# Altium schematic symbol library BARKO_SCHLIB.SchLib: 1064 symbols (part 9 of 11) (continued)
## R-20K-0805 (continued)
RES SMD 20K OHM 1/8W 1% 0805; Manufacturer: Panasonic; Manufacturer Part Number: ERJ-6ENF2002V; Resistance: 20kR; Temperature Coefficient: 100ppm/°C; Max Power Dissipation: 125mW; Voltage Rating: 150V; .PCBCHK: USED; .Creator: F:TALI; Washability: OK; Stock 1: 293552; Pricing 1: 1=0.1, 10=0.081, 100=0.0311, 1000=0.01367, 2500=0.01181 (USD); Mount: Surface Mount; Case/Package: 0805; Contact Plating: Tin; Case Code (Metric): 2012; Min Operating Temperature: -55°C; Max Operating Temperature: 155°C; Tolerance: 1%; Composition: Thick Film; Packaging: Tape and Reel; Package Quantity: 1; Number of Terminations: 2; Features: Automotive AEC-Q200; Power Rating: 125mW; Military Standard: Not; Termination: SMD/SMT; Voltage Rating (DC): 150V; Working Voltage: 150V; Length: 2mm; Height: 0.6mm; Width: 0.049inch; Depth: 1.25mm; Radiation Hardening: No; REACH SVHC: No SVHC; Lead Free: Lead Free; ComponentLink1URL: http://www.farnell.com/datasheets/1911175.pdf; ComponentLink1Description: http://www.farnell.com/datasheets/1911175.pdf; ComponentLink2URL: https://www.alliedelec.com/m/d/623f45ff1957d936ff56d46fd1c28cac.pdf; ComponentLink2Description: https://www.alliedelec.com/m/d/623f45ff1957d936ff56d46fd1c28cac.pdf; ComponentLink3URL: http://industrial.panasonic.com/www-data/pdf/AOA0000/AOA0000CE2.pdf; ComponentLink3Description: http://industrial.panasonic.com/www-data/pdf/AOA0000/AOA0000CE2.pdf; ComponentLink4URL: https://www.verical.com/server-webapp/html/getDatasheet?partID=249649; ComponentLink4Description: https://www.verical.com/server-webapp/html/getDatasheet?partID=249649; ComponentLink5URL: http://www.farnell.com/datasheets/426256.pdf; ComponentLink5Description: http://www.farnell.com/datasheets/426256.pdf; ComponentLink6URL: http://www.mouser.com/ds/2/315/AOA0000C283-1093288.pdf; ComponentLink6Description: http://www.mouser.com/ds/2/315/AOA0000C283-1093288.pdf; ComponentLink7URL: http://www.farnell.com/datasheets/1678782.pdf; ComponentLink7Description: http://www.farnell.com/datasheets/1678782.pdf; Stock 2: 33862; Pricing 2: 1=0.1, 10=0.021, 100=0.0086, 1000=0.00385, 2500=0.00334 (USD); ComponentLink8URL: https://www.verical.com/server-webapp/html/getDatasheet?partID=464225; ComponentLink8Description: https://www.verical.com/server-webapp/html/getDatasheet?partID=464225; Stock 3: 3925405; Pricing 3: 1=0.1, 10=0.046, 100=0.0186, 1000=0.00835, 2500=0.00725 (USD); Number of Pins: 2; ComponentLink9URL: http://documents.rs-components.com/techlib://itc_doclist_GB.htm?stockno=6183858; ComponentLink9Description: http://documents.rs-components.com/techlib://itc_doclist_GB.htm?stockno=6183858; ComponentLink10URL: https://www.verical.com/server-webapp/html/getDatasheet?partID=330251; ComponentLink10Description: https://www.verical.com/server-webapp/html/getDatasheet?partID=330251; ComponentLink11URL: http://www.farnell.com/datasheets/444164.pdf; ComponentLink11Description: http://www.farnell.com/datasheets/444164.pdf; ComponentLink12URL: http://www.yageo.ru/pdf/RC0805.pdf; ComponentLink12Description: http://www.yageo.ru/pdf/RC0805.pdf; .SCHCHK: USED; Supplier 1: Digi-Key; Supplier Part Number 1: P20.0KCDKR-ND
footprint R-0805
pins: 1, 2

## R-20R-1206
designator R?, comment 20R  Power Rating: 1/4W  Case Code (Imperial): 1206
RES SMD 20 OHM 1/4W 5% 1206; Manufacturer: Yageo; Manufacturer Part Number: RC1206JR-0720RL; Temperature Coefficient: 100ppm/°C; Voltage Rating: 200V; Max Power Dissipation: 250mW; .PCBCHK: USED; .Creator: F:TALI; Washability: OK; Stock 1: 401769; Pricing 1: 1=0.1, 10=0.07, 100=0.0284, 1000=0.01274, 2500=0.01106 (USD); Case/Package: 1206; Contact Plating: Matte,Tin; Case Code (Metric): 3216; Min Operating Temperature: -55°C; Max Operating Temperature: 155°C; Resistance: 20R; Tolerance: 5%; Composition: Thick Film; Packaging: Tape and Reel; Termination: SMD/SMT; Military Standard: Not; Voltage Rating (DC): 200V; Length: 3.1mm; Depth: 1.6mm; Radiation Hardening: No; Lead Free: Lead Free; ComponentLink1URL: http://www.yageo.com/documents/recent/PYu-RC1206_51_RoHS_L-4.pdf; ComponentLink1Description: http://www.yageo.com/documents/recent/PYu-RC1206_51_RoHS_L-4.pdf; Stock 2: 32269; Pricing 2: 1=0.1, 10=0.043, 100=0.0173, 1000=0.00778, 2500=0.00676 (USD); Mount: Surface Mount; Package Quantity: 1; Number of Terminations: 2; Features: Moisture Resistant; Height: 0.03inch; Width: 0.063inch; Thickness: 610um; ComponentLink2URL: http://www.bourns.com/docs/Product-Datasheets/CHPREZTR.pdf; ComponentLink2Description: http://www.bourns.com/docs/Product-Datasheets/CHPREZTR.pdf; ComponentLink3URL: http://www.mouser.com/ds/2/54/chpreztr-977002.pdf; ComponentLink3Description: http://www.mouser.com/ds/2/54/chpreztr-977002.pdf; ComponentLink4URL: https://www.bourns.com/docs/Product-Datasheets/CHPREZTR.pdf; ComponentLink4Description: https://www.bourns.com/docs/Product-Datasheets/CHPREZTR.pdf; ComponentLink5URL: http://www.bourns.com/pdfs/chpreztr.pdf; ComponentLink5Description: http://www.bourns.com/pdfs/chpreztr.pdf; Weight: 0.000353oz; Working Voltage: 200V; REACH SVHC: Unknown; ComponentLink6URL: http://www.vishay.com/docs/20035/dcrcwe3.pdf; ComponentLink6Description: http://www.vishay.com/docs/20035/dcrcwe3.pdf; ComponentLink7URL: https://www.alliedelec.com/m/d/0c934d6939ccefa68dbe0b96d821c8cf.pdf; ComponentLink7Description: https://www.alliedelec.com/m/d/0c934d6939ccefa68dbe0b96d821c8cf.pdf; ComponentLink8URL: http://www.farnell.com/datasheets/2046716.pdf; ComponentLink8Description: http://www.farnell.com/datasheets/2046716.pdf; ComponentLink9URL: http://www.farnell.com/datasheets/2111203.pdf; ComponentLink9Description: http://www.farnell.com/datasheets/2111203.pdf; ComponentLink10URL: http://www.mouser.com/ds/2/427/dcrcwe3-109170.pdf; ComponentLink10Description: http://www.mouser.com/ds/2/427/dcrcwe3-109170.pdf; Stock 3: 63200; Pricing 3: 100=0.0169, 1000=0.0069, 5000=0.0043, 15000=0.0038, 50000=0.0035 (USD); .SCHCHK: USED; Supplier 1: Digi-Key; Supplier Part Number 1: 311-20ERCT-ND
footprint R-1206
pins: 1, 2

## R-22K1-0805
designator R?, comment 22K1  Case/Package: 0805
RES 22.1K OHM 1% 1/8W 0805; Manufacturer 1: Stackpole Electronics; Manufacturer Part Number: RMCF0805FT22K1; Resistance: 22.1kR; Power Rating: 125mW; Temperature Coefficient: 100ppm/°C; .Creator: M.OZKAN; .PCBCHK: USED; Supplier 1: Digi-Key; Supplier Part Number 1: RMCF0805FT22K1CT-ND; RoHS: Yes; Category: Chip SMD Resistors; Stock: 28900; Pricing: 1=0,10000, 10=0,02600, 100=0,01040, 1000=0,00466, 2500=0,00405 (USD); Mount: Surface Mount; Case Code (Metric): 2012; Case Code (Imperial): 0805; Contact Plating: Tin,Matte; Min Operating Temperature: -55°C; Max Operating Temperature: 155°C; Features: Automotive AEC-Q200; Packaging: Tape and Reel; Tolerance: 1%; Number of Terminations: 2; Military Standard: Not; Composition: Thick Film; Max Power Dissipation: 125mW; Length: 0.079inch; Height: 0.026inch; Width: 0.049inch; Depth: 1.25mm; Radiation Hardening: No; Lead Free: Lead Free; ComponentLink1URL: https://datasheet.ciiva.com/15193/getdatasheetpartid-409700-15193558.pdf?src-supplier=Verical; ComponentLink1Description: https://datasheet.ciiva.com/15193/getdatasheetpartid-409700-15193558.pdf?src-supplier=Verical; .SCHCHK: USED
footprint R-0805
pins: 1, 2

## R-22K-0603
designator R?, comment 22K  Case Code (Imperial): 0603
RES SMD 22K OHM 1% 1/8W 0603; Manufacturer: Vishay Beyschlag; Manufacturer Part Number: MCT06030C2202FP500; Resistance: 22kR; Temperature Coefficient: 50ppm/°C; Power Rating: 125mW; Voltage Rating: 75V; .PCBCHK: USED; .Creator: F:TALI; Washability: OK; Supplier 1: Digi-Key; Supplier Part Number 1: MCT0603-22.0K-CFDKR-ND; Stock 1: 132469; Pricing 1: 1=0.18, 10=0.152, 100=0.0596, 1000=0.02495, 2500=0.02287 (USD); Case/Package: 0603; Contact Plating: Tin; Case Code (Metric): 1608; Min Operating Temperature: -55°C; Max Operating Temperature: 125°C; Tolerance: 1%; Composition: Thin Film; Package Quantity: 5000; Packaging: Tape and Reel; Number of Terminations: 2; Military Standard: Not; Max Power Dissipation: 125mW; Voltage Rating (DC): 75V; Length: 0.061inch; Height: 0.022inch; Width: 0.033inch; Depth: 0.85mm; Radiation Hardening: No; REACH SVHC: No SVHC; Lead Free: Lead Free; ComponentLink1URL: http://www.vishay.com/docs/28705/mc_pro.pdf; ComponentLink1Description: http://www.vishay.com/docs/28705/mc_pro.pdf; .SCHCHK: USED
footprint R-0603
pins: 1, 2

## R-22K-0805
designator R?, comment 22K  Case/Package: 0805
RES SMD 22K OHM 1% 1/8W 0805; Manufacturer: Yageo; Manufacturer Part Number: RC0805FR-0722KL; Resistance: 22kR; Temperature Coefficient: 100ppm/°C; Power Rating: 125mW; Voltage Rating: 150V; .PCBCHK: USED; .Creator: F:TALI; Washability: OK; Stock 1: 409524; Weight: 0.000194oz; Case Code (Imperial): 0805; Case Code (Metric): 2012; Min Operating Temperature: -55°C; Max Operating Temperature: 155°C; Tolerance: 1%; Packaging: Tape and Reel; Composition: Thick Film; Package Quantity: 1; Termination: SMD/SMT; Number of Terminations: 2; Military Standard: Not; Max Power Dissipation: 125mW; Working Voltage: 150V; Features: Moisture Resistant; Length: 2mm; Height: 0.5mm; Width: 1.25mm; Depth: 1.25mm; REACH SVHC: Unknown; Lead Free: Lead Free; ComponentLink1URL: http://www.mouser.com/ds/2/447/Yageo_08112016_RC0805-968729.pdf; ComponentLink1Description: http://www.mouser.com/ds/2/447/Yageo_08112016_RC0805-968729.pdf; ComponentLink2URL: http://www.farnell.com/datasheets/444164.pdf; ComponentLink2Description: http://www.farnell.com/datasheets/444164.pdf; ComponentLink3URL: http://www.yageo.com/documents/recent/PYu-RC_Group_51_RoHS_L_9.pdf; ComponentLink3Description: http://www.yageo.com/documents/recent/PYu-RC_Group_51_RoHS_L_9.pdf; ComponentLink4URL: http://www.yageo.com/documents/recent/PYu-RC_Group_51_RoHS_L_8.pdf; ComponentLink4Description: http://www.yageo.com/documents/recent/PYu-RC_Group_51_RoHS_L_8.pdf; ComponentLink5URL: http://www.yageo.ru/pdf/RC0805.pdf; ComponentLink5Description: http://www.yageo.ru/pdf/RC0805.pdf; Stock 2: 239333; Pricing 2: 1=0.1, 10=0.059, 100=0.024, 1000=0.01079, 2500=0.00936 (USD); Contact Plating: Tin; Voltage Rating (DC): 150V; Radiation Hardening: No; ComponentLink6URL: http://www.samsungsem.com/kr/support/library/product-catalog/__icsFiles/afieldfile/2015/09/22/CHIP_RESISTOR_2015.pdf; ComponentLink6Description: http://www.samsungsem.com/kr/support/library/product-catalog/__icsFiles/afieldfile/2015/09/22/CHIP_RESISTOR_2015.pdf; ComponentLink7URL: http://www.samsungsem.com/kr/support/product-search/chip-resistor/RC2012F223CS.jsp; ComponentLink7Description: http://www.samsungsem.com/kr/support/product-search/chip-resistor/RC2012F223CS.jsp; Stock 3: 292101; Pricing 3: 1=0.1, 10=0.091, 100=0.0349, 1000=0.01536, 2500=0.01327 (USD); Mount: Surface Mount; Number of Pins: 2; ComponentLink8URL: http://www.mouser.com/ds/2/315/AOA0000CE2-37512.pdf; ComponentLink8Description: http://www.mouser.com/ds/2/315/AOA0000CE2-37512.pdf; ComponentLink9URL: http://www.farnell.com/datasheets/426256.pdf; ComponentLink9Description: http://www.farnell.com/datasheets/426256.pdf; ComponentLink10URL: http://www.farnell.com/datasheets/1678782.pdf; ComponentLink10Description: http://www.farnell.com/datasheets/1678782.pdf; ComponentLink11URL: https://www.alliedelec.com/m/d/623f45ff1957d936ff56d46fd1c28cac.pdf; ComponentLink11Description: https://www.alliedelec.com/m/d/623f45ff1957d936ff56d46fd1c28cac.pdf; ComponentLink12URL: http://industrial.panasonic.com/www-data/pdf/AOA0000/AOA0000CE2.pdf; ComponentLink12Description: http://industrial.panasonic.com/www-data/pdf/AOA0000/AOA0000CE2.pdf; .SCHCHK: USED; Supplier 1: Digi-Key; Supplier Part Number 1: 311-22.0KCRCT-ND
footprint R-0805
pins: 1, 2

## R-22K-1206
designator R?, comment 22K  Power Rating: 1/4W  Case Code (Imperial): 1206
RES SMD 22K OHM 1% 1/4W 1206; Manufacturer: Panasonic; Manufacturer Part Number: ERJ-8ENF2202V; Resistance: 22kR; Temperature Coefficient: 100ppm/°C; Voltage Rating: 200V; Max Power Dissipation: 250mW; .PCBCHK: USED; .Creator: F:TALI; Washability: OK; Stock 1: 5013; Pricing 1: 1=0.11, 10=0.1, 100=0.0385, 1000=0.01695, 2500=0.01464 (USD); Mount: Surface Mount; Case/Package: 1206; Number of Pins: 2; Contact Plating: Tin; Case Code (Metric): 3216; Min Operating Temperature: -55°C; Max Operating Temperature: 155°C; Tolerance: 1%; Composition: Thick Film; Packaging: Tape and Reel; Package Quantity: 1; Number of Terminations: 2; Termination: SMD/SMT; Military Standard: Not; Voltage Rating (DC): 200V; Features: Automotive AEC-Q200; Length: 3.2mm; Height: 0.6mm; Width: 0.063inch; Depth: 1.6mm; Radiation Hardening: No; REACH SVHC: No SVHC; ComponentLink1URL: http://www.farnell.com/datasheets/1678782.pdf; ComponentLink1Description: http://www.farnell.com/datasheets/1678782.pdf; ComponentLink2URL: http://www.farnell.com/datasheets/426256.pdf; ComponentLink2Description: http://www.farnell.com/datasheets/426256.pdf; ComponentLink3URL: http://www.mouser.com/ds/2/315/AOA0000C283-1093288.pdf; ComponentLink3Description: http://www.mouser.com/ds/2/315/AOA0000C283-1093288.pdf; Stock 2: 28064; Pricing 2: 1=0.1, 10=0.064, 100=0.026, 1000=0.01166, 2500=0.01012 (USD); Thickness: 610um; ComponentLink4URL: http://www.mouser.com/ds/2/54/chpreztr-977002.pdf; ComponentLink4Description: http://www.mouser.com/ds/2/54/chpreztr-977002.pdf; ComponentLink5URL: http://www.bourns.com/docs/Product-Datasheets/CHPREZTR.pdf; ComponentLink5Description: http://www.bourns.com/docs/Product-Datasheets/CHPREZTR.pdf; ComponentLink6URL: http://www.bourns.com/pdfs/chpreztr.pdf; ComponentLink6Description: http://www.bourns.com/pdfs/chpreztr.pdf; ComponentLink7URL: https://www.bourns.com/docs/Product-Datasheets/CHPREZTR.pdf; ComponentLink7Description: https://www.bourns.com/docs/Product-Datasheets/CHPREZTR.pdf; Stock 3: 26462; Pricing 3: 1=0.1, 10=0.03, 100=0.0121, 1000=0.00545, 2500=0.00473 (USD); Lead Free: Lead Free; ComponentLink8URL: https://www.verical.com/server-webapp/html/getDatasheet?partID=369949; ComponentLink8Description: https://www.verical.com/server-webapp/html/getDatasheet?partID=369949; .SCHCHK: USED; Supplier 1: Digi-Key; Supplier Part Number 1: P22.0KFDKR-ND
footprint R-1206
pins: 1, 2

## R-22R-0603
designator R?, comment 22R  Case Code (Imperial): 0603
RES SMD 22 OHM 5% 1/10W 0603; Manufacturer: Yageo; Manufacturer Part Number: RC0603JR-0722RL; Temperature Coefficient: 100ppm/°C; Power Rating: 100mW; Voltage Rating: 50V; .PCBCHK: USED; .Creator: F:TALI; Washability: OK; Stock 1: 3612; Pricing 1: 1=0.1, 10=0.022, 100=0.0088, 1000=0.00396, 2500=0.00344 (USD); Case/Package: 0603; Number of Pins: 2; Case Code (Metric): 1608; Min Operating Temperature: -55°C; Max Operating Temperature: 155°C; Resistance: 22R; Tolerance: 5%; Packaging: Tape and Reel; Composition: Thick Film; Military Standard: Not; Voltage Rating (DC): 50V; Termination: SMD/SMT; Length: 1.6mm; Depth: 0.8mm; Width: 0.8mm; Lead Free: Lead Free; REACH SVHC: No SVHC; ComponentLink1URL: https://www.verical.com/server-webapp/html/getDatasheet?partID=493085; ComponentLink1Description: https://www.verical.com/server-webapp/html/getDatasheet?partID=493085; ComponentLink2URL: http://www.farnell.com/datasheets/443971.pdf; ComponentLink2Description: http://www.farnell.com/datasheets/443971.pdf; Stock 2: 152242; Pricing 2: 1=0.1, 10=0.033, 100=0.0136, 1000=0.00609, 2500=0.00529 (USD); Contact Plating: Tin; Package Quantity: 1; Number of Terminations: 2; Max Power Dissipation: 100mW; Features: Moisture Resistant; Height: 0.022inch; Radiation Hardening: No; Mount: Surface Mount; Weight: 7.1E-05oz; ComponentLink3URL: http://www.farnell.com/datasheets/1678782.pdf; ComponentLink3Description: http://www.farnell.com/datasheets/1678782.pdf; ComponentLink4URL: http://www.farnell.com/datasheets/1911175.pdf; ComponentLink4Description: http://www.farnell.com/datasheets/1911175.pdf; ComponentLink5URL: http://www.farnell.com/datasheets/426256.pdf; ComponentLink5Description: http://www.farnell.com/datasheets/426256.pdf; Stock 3: 1570000; Pricing 3: 100=0.0125, 1000=0.0035, 5000=0.002, 15000=0.00165, 50000=0.0014 (USD); .SCHCHK: USED; Supplier 1: Digi-Key; Supplier Part Number 1: 311-22GRCT-ND
footprint R-0603
pins: 1, 2

## R-24K3-0402
designator R?, comment 24K3  Case Code (Imperial): 0402
RES SMD 24.3K OHM 1% 1/10W 0402; Manufacturer: Panasonic; Manufacturer Part Number: ERJ-2RKF2432X; Resistance: 24.3kR; Power Rating: 100mW; Voltage Rating: 50V; Temperature Coefficient: 100ppm/°C; .PCBCHK: USED; .Creator: F:TALI; Washability: OK; Stock 1: 471142; Pricing 1: 1=0.1, 10=0.045, 100=0.0183, 1000=0.00823, 2500=0.00715, 5000=0.0059 (USD); Mount: Surface Mount; Case/Package: 0402; Case Code (Metric): 1005; Contact Plating: Tin; Min Operating Temperature: -55°C; Max Operating Temperature: 155°C; Packaging: Tape and Reel; Tolerance: 1%; Package Quantity: 1; Composition: Thick Film; Number of Terminations: 2; Termination: SMD/SMT; Military Standard: Not; Max Power Dissipation: 100mW; Voltage Rating (DC): 50V; Features: Automotive AEC-Q200; Length: 1mm; Height: 0.35mm; Width: 0.02inch; Depth: 0.5mm; Radiation Hardening: No; REACH SVHC: No SVHC; Lead Free: Lead Free; ComponentLink1URL: http://www.industrial.panasonic.com/www-data/pdf/AOA0000/AOA0000CE2.pdf; ComponentLink1Description: http://www.industrial.panasonic.com/www-data/pdf/AOA0000/AOA0000CE2.pdf; ComponentLink2URL: http://www.farnell.com/datasheets/1911175.pdf; ComponentLink2Description: http://www.farnell.com/datasheets/1911175.pdf; ComponentLink3URL: https://www.alliedelec.com/m/d/623f45ff1957d936ff56d46fd1c28cac.pdf; ComponentLink3Description: https://www.alliedelec.com/m/d/623f45ff1957d936ff56d46fd1c28cac.pdf; ComponentLink4URL: http://www.farnell.com/datasheets/1678782.pdf; ComponentLink4Description: http://www.farnell.com/datasheets/1678782.pdf; ComponentLink5URL: http://www.mouser.com/ds/2/315/AOA0000CE2-37512.pdf; ComponentLink5Description: http://www.mouser.com/ds/2/315/AOA0000CE2-37512.pdf; Stock 2: 9465; Pricing 2: 1=0.1, 10=0.021, 100=0.0087, 1000=0.00391, 2500=0.00339, 5000=0.0028 (USD); ComponentLink6URL: http://www.samsungsem.com/kr/support/library/product-catalog/__icsFiles/afieldfile/2015/09/22/CHIP_RESISTOR_2015.pdf; ComponentLink6Description: http://www.samsungsem.com/kr/support/library/product-catalog/__icsFiles/afieldfile/2015/09/22/CHIP_RESISTOR_2015.pdf; ComponentLink7URL: http://www.samsungsem.com/kr/support/product-search/chip-resistor/RC1005F2432CS.jsp; ComponentLink7Description: http://www.samsungsem.com/kr/support/product-search/chip-resistor/RC1005F2432CS.jsp; ComponentLink8URL: https://produktinfo.conrad.com/datenblaetter/625000-649999/631765-da-01-en-SMD_WID_RC_1005_24K3_1__0_063W_10000ST.pdf; ComponentLink8Description: https://produktinfo.conrad.com/datenblaetter/625000-649999/631765-da-01-en-SMD_WID_RC_1005_24K3_1__0_063W_10000ST.pdf; Stock 3: 6427; Pricing 3: 1=0.1, 10=0.016, 100=0.0064, 1000=0.00289, 2500=0.0025, 5000=0.00207 (USD); Working Voltage: 50V; .SCHCHK: USED; Supplier 1: Digi-Key; Supplier Part Number 1: RMCF0402FT24K3CT-ND
footprint R-0402
pins: 1, 2

## R-24K9-0603
designator R?, comment 24K9  Case/Package: 0603  Tolerance: 1%
RES 24.9K OHM 1% 1/10W 0603; Manufacturer: Stackpole Electronics; Manufacturer Part Number: RMCF0603FT24K9; Resistance: 24.9kR; Power Rating: 100mW; Temperature Coefficient: 100ppm/°C; .Creator: M.OZKAN; .PCBCHK: USED; Supplier 1: Digi-Key; Supplier Part Number 1: RMCF0603FT24K9CT-ND; Stock: 149638; Pricing: 1=0.1, 10=0.016, 100=0.0065, 1000=0.0029, 2500=0.0025 (USD); RoHS: Yes; Mount: Surface Mount; Case Code (Imperial): 0603; Contact Plating: Tin,Matte; Case Code (Metric): 1608; Min Operating Temperature: -55°C; Max Operating Temperature: 155°C; Packaging: Tape and Reel; Composition: Thick Film; Number of Terminations: 2; Max Power Dissipation: 100mW; Features: Automotive AEC-Q200; Length: 0.061inch; Height: 0.022inch; Width: 0.031inch; Radiation Hardening: No; Lead Free: Lead Free; ComponentLink1URL: http://components.arrow.com/part/dataview/50576347S797719N1174?src-supplier=Arrow; ComponentLink1Description: http://components.arrow.com/part/dataview/50576347S797719N1174?src-supplier=Arrow; ComponentLink2URL: http://www.seielect.com/Catalog/SEI-RMC.pdf?src-supplier=Future+Electronics; ComponentLink2Description: http://www.seielect.com/Catalog/SEI-RMC.pdf?src-supplier=Future+Electronics; ComponentLink3URL: https://www.seielect.com/catalog/SEI-RMCF_RMCP.pdf?src-supplier=Avnet; ComponentLink3Description: https://www.seielect.com/catalog/SEI-RMCF_RMCP.pdf?src-supplier=Avnet; ComponentLink4URL: https://www.seielect.com/catalog/SEI-Packaging.pdf?src-supplier=Digi-Key; ComponentLink4Description: https://www.seielect.com/catalog/SEI-Packaging.pdf?src-supplier=Digi-Key; ComponentLink5URL: https://www.seielect.com/catalog/SEI-RMCF_RMCP.pdf?src-supplier=Avnet+Asia; ComponentLink5Description: https://www.seielect.com/catalog/SEI-RMCF_RMCP.pdf?src-supplier=Avnet+Asia; ComponentLink6URL: https://www.seielect.com/Catalog/SEI-RMCF_RMCP.pdf?src-supplier=Digi-Key; ComponentLink6Description: https://www.seielect.com/Catalog/SEI-RMCF_RMCP.pdf?src-supplier=Digi-Key; .SCHCHK: USED
footprint R-0603
pins: 1, 2

## R-27K-0603
designator R?, comment 27K  Case/Package: 0603
RES SMD 27K OHM 1% 1/10W 0603; Manufacturer: Yageo; Manufacturer Part Number: RC0603FR-0727KL; Resistance: 27kR; Temperature Coefficient: 100ppm/°C; Max Power Dissipation: 100mW; Voltage Rating: 50V; Working Voltage: 75V; Washability: OK; .Creator: M.OZKAN; .PCBCHK: USED; Supplier 1: Digi-Key; Supplier Part Number 1: 311-27.0KHRCT-ND; Stock 1: 2530598; Pricing 1: 1=0.10000, 10=0.02300, 100=0.00940, 1000=0.00421, 2500=0.00366 (USD); RoHS: Yes; Number of Pins: 2; Case Code (Metric): 1608; Case Code (Imperial): 0603; Min Operating Temperature: -55°C; Max Operating Temperature: 155°C; Tolerance: 1%; Composition: Thick Film; Packaging: Tape and Reel; Number of Terminations: 2; Power Rating: 100mW; Features: Moisture Resistant; Termination: SMD/SMT; Military Standard: Not; Voltage Rating (DC): 50V; Package Quantity: 1; Length: 0.063inch; Height: 0.022inch; Width: 0.031inch; Depth: 0.8mm; Lead Free: Lead Free; REACH SVHC: No SVHC; ComponentLink1URL: https://datasheet.ciiva.com/11808/0900766b80f96399-11808540.pdf?src-supplier=RSComponents; ComponentLink1Description: https://datasheet.ciiva.com/11808/0900766b80f96399-11808540.pdf?src-supplier=RSComponents; ComponentLink2URL: https://datasheet.ciiva.com/2453/pyu-r-int-thick-7-2453968.pdf?src-supplier=Digi-Key; ComponentLink2Description: https://datasheet.ciiva.com/2453/pyu-r-int-thick-7-2453968.pdf?src-supplier=Digi-Key; ComponentLink3URL: https://datasheet.ciiva.com/2453/pyu-r-int-thick-7-2453969.pdf?src-supplier=Digi-Key; ComponentLink3Description: https://datasheet.ciiva.com/2453/pyu-r-int-thick-7-2453969.pdf?src-supplier=Digi-Key; ComponentLink4URL: https://datasheet.ciiva.com/7746/443971-7746311.pdf?src-supplier=Element14; ComponentLink4Description: https://datasheet.ciiva.com/7746/443971-7746311.pdf?src-supplier=Element14; ComponentLink5URL: https://datasheet.ciiva.com/7746/443971-7746312.pdf?src-supplier=Element14; ComponentLink5Description: https://datasheet.ciiva.com/7746/443971-7746312.pdf?src-supplier=Element14; ComponentLink6URL: https://datasheet.ciiva.com/15159/getdatasheetpartid-45811-15159564.pdf?src-supplier=Verical; ComponentLink6Description: https://datasheet.ciiva.com/15159/getdatasheetpartid-45811-15159564.pdf?src-supplier=Verical; ComponentLink7URL: https://datasheet.ciiva.com/2453/pyu-r-int-thick-7-2453967.pdf?src-supplier=Digi-Key; ComponentLink7Description: https://datasheet.ciiva.com/2453/pyu-r-int-thick-7-2453967.pdf?src-supplier=Digi-Key; ComponentLink8URL: https://datasheet.ciiva.com/46412/443971-46412847.pdf?src-supplier=Element14; ComponentLink8Description: https://datasheet.ciiva.com/46412/443971-46412847.pdf?src-supplier=Element14; .SCHCHK: USED
footprint R-0603
pins: 1, 2

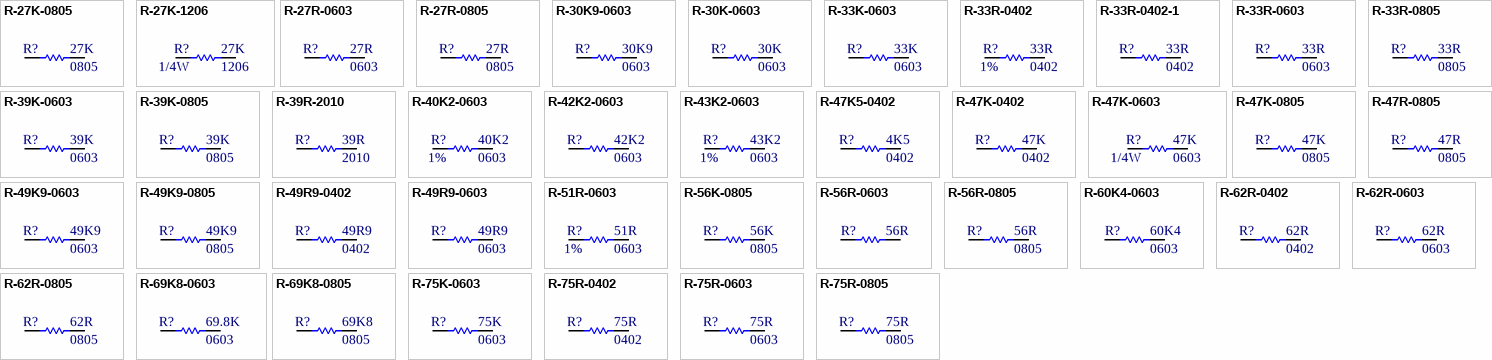
[diagram p38: symbols R-27K-0805 to R-75R-0805]

## R-27K-0805
designator R?, comment 27K  Case/Package: 0805
RES SMD 27K OHM 1% 1/8W 0805; Manufacturer: Yageo; Manufacturer Part Number: RC0805FR-0727KL; Resistance: 27kR; Temperature Coefficient: 100ppm/°C; Power Rating: 125mW; Voltage Rating: 150V; .PCBCHK: USED; .Creator: F:TALI; Washability: OK; Stock 1: 5708; Pricing 1: 1=0.1, 10=0.046, 100=0.0186, 1000=0.00835, 2500=0.00725 (USD); Case Code (Metric): 2012; Case Code (Imperial): 0805; Min Operating Temperature: -55°C; Max Operating Temperature: 155°C; Tolerance: 1%; Composition: Thick Film; Packaging: Tape and Reel; Package Quantity: 1; Number of Terminations: 2; Termination: SMD/SMT; Military Standard: Not; Max Power Dissipation: 125mW; Features: Moisture Resistant; Length: 2mm; Height: 0.5mm; Width: 0.049inch; Depth: 1.25mm; REACH SVHC: Unknown; Lead Free: Lead Free; ComponentLink1URL: http://www.yageo.com.tw/exep/pages/download/literatures/PYu-R_INT-thick_7.pdf; ComponentLink1Description: http://www.yageo.com.tw/exep/pages/download/literatures/PYu-R_INT-thick_7.pdf; ComponentLink2URL: http://www.yageo.com/documents/recent/PYu-RC_Group_51_RoHS_L_9.pdf; ComponentLink2Description: http://www.yageo.com/documents/recent/PYu-RC_Group_51_RoHS_L_9.pdf; ComponentLink3URL: http://documents.rs-components.com/techlib://itc_doclist_GB.htm?stockno=6184198; ComponentLink3Description: http://documents.rs-components.com/techlib://itc_doclist_GB.htm?stockno=6184198; ComponentLink4URL: http://www.farnell.com/datasheets/444164.pdf; ComponentLink4Description: http://www.farnell.com/datasheets/444164.pdf; Stock 2: 91448; Pricing 2: 1=0.1, 10=0.081, 100=0.0311, 1000=0.01367, 2500=0.01181 (USD); Mount: Surface Mount; Number of Pins: 2; Contact Plating: Tin; Voltage Rating (DC): 150V; Radiation Hardening: No; ComponentLink5URL: http://www.farnell.com/datasheets/1678782.pdf; ComponentLink5Description: http://www.farnell.com/datasheets/1678782.pdf; ComponentLink6URL: http://www.farnell.com/datasheets/426256.pdf; ComponentLink6Description: http://www.farnell.com/datasheets/426256.pdf; ComponentLink7URL: http://industrial.panasonic.com/www-data/pdf/AOA0000/AOA0000CE2.pdf; ComponentLink7Description: http://industrial.panasonic.com/www-data/pdf/AOA0000/AOA0000CE2.pdf; ComponentLink8URL: https://www.alliedelec.com/m/d/623f45ff1957d936ff56d46fd1c28cac.pdf; ComponentLink8Description: https://www.alliedelec.com/m/d/623f45ff1957d936ff56d46fd1c28cac.pdf; Stock 3: 65860; Pricing 3: 1=0.1, 10=0.059, 100=0.024, 1000=0.01079, 2500=0.00936 (USD); ComponentLink9URL: http://www.samsungsem.com/kr/support/library/product-catalog/__icsFiles/afieldfile/2015/09/22/CHIP_RESISTOR_2015.pdf; ComponentLink9Description: http://www.samsungsem.com/kr/support/library/product-catalog/__icsFiles/afieldfile/2015/09/22/CHIP_RESISTOR_2015.pdf; .SCHCHK: USED; Supplier 1: Digi-Key; Supplier Part Number 1: 311-27.0KCRDKR-ND
footprint R-0805
pins: 1, 2

## R-27K-1206
designator R?, comment 27K  Power Rating: 1/4W  Case Code (Imperial): 1206
RES SMD 27K OHM 1% 1/4W 1206; Manufacturer: Panasonic; Manufacturer Part Number: ERJ-8ENF2702V; Resistance: 27kR; Temperature Coefficient: 100ppm/°C; Voltage Rating: 200V; Max Power Dissipation: 250mW; .PCBCHK: USED; .Creator: F:TALI; Washability: OK; Stock 1: 25351; Pricing 1: 1=0.11, 10=0.1, 100=0.0385, 1000=0.01695, 2500=0.01464 (USD); Mount: Surface Mount; Case/Package: 1206; Number of Pins: 2; Contact Plating: Tin; Case Code (Metric): 3216; Min Operating Temperature: -55°C; Max Operating Temperature: 155°C; Tolerance: 1%; Composition: Thick Film; Packaging: Tape and Reel; Package Quantity: 1; Number of Terminations: 2; Termination: SMD/SMT; Military Standard: Not; Voltage Rating (DC): 200V; Features: Automotive AEC-Q200; Length: 3.2mm; Height: 0.028inch; Width: 0.063inch; Depth: 1.6mm; Radiation Hardening: No; REACH SVHC: No SVHC; ComponentLink1URL: http://www.farnell.com/datasheets/426256.pdf; ComponentLink1Description: http://www.farnell.com/datasheets/426256.pdf; ComponentLink2URL: http://www.mouser.com/ds/2/315/AOA0000CE2-37512.pdf; ComponentLink2Description: http://www.mouser.com/ds/2/315/AOA0000CE2-37512.pdf; ComponentLink3URL: http://industrial.panasonic.com/www-data/pdf/AOA0000/AOA0000CE2.pdf; ComponentLink3Description: http://industrial.panasonic.com/www-data/pdf/AOA0000/AOA0000CE2.pdf; ComponentLink4URL: http://www.industrial.panasonic.com/www-data/pdf/AOA0000/AOA0000CE2.pdf; ComponentLink4Description: http://www.industrial.panasonic.com/www-data/pdf/AOA0000/AOA0000CE2.pdf; Stock 2: 87290; Pricing 2: 1=0.1, 10=0.081, 100=0.0331, 1000=0.01487, 2500=0.01291 (USD); Lead Free: Lead Free; ComponentLink5URL: http://www.yageo.com/documents/recent/PYu-RC1206_51_RoHS_L-4.pdf; ComponentLink5Description: http://www.yageo.com/documents/recent/PYu-RC1206_51_RoHS_L-4.pdf; ComponentLink6URL: http://www.yageo.com/documents/recent/PYu-RC_Group_51_RoHS_L_9.pdf; ComponentLink6Description: http://www.yageo.com/documents/recent/PYu-RC_Group_51_RoHS_L_9.pdf; ComponentLink7URL: http://www.yageo.com.tw/exep/pages/download/literatures/PYu-R_INT-thick_7.pdf; ComponentLink7Description: http://www.yageo.com.tw/exep/pages/download/literatures/PYu-R_INT-thick_7.pdf; ComponentLink8URL: http://www.farnell.com/datasheets/444357.pdf; ComponentLink8Description: http://www.farnell.com/datasheets/444357.pdf; Stock 3: 43; Pricing 3: 1=0.1, 10=0.029 (USD); ComponentLink9URL: //media.digikey.com/pdf/Data%20Sheets/Rohm%20PDFs/MCR18_SeriesComparativeSpec.pdf; ComponentLink9Description: //media.digikey.com/pdf/Data%20Sheets/Rohm%20PDFs/MCR18_SeriesComparativeSpec.pdf; .SCHCHK: USED; Supplier 1: Digi-Key; Supplier Part Number 1: P27.0KFCT-ND
footprint R-1206
pins: 1, 2

## R-27R-0603
designator R?, comment 27R  Case Code (Imperial): 0603
RES SMD 27 OHM 1% 1/10W 0603; Manufacturer: Stackpole Electronics; Manufacturer Part Number: RMCF0603FT27R0; Max Power Dissipation: 100mW; Temperature Coefficient: 100ppm/°C; Voltage Rating: 75V; .PCBCHK: USED; .Creator: F:TALI; Washability: OK; Stock 1: 10; Pricing 1: 1=0.1, 10=0.018, 100=0.0071, 1000=0.00321, 2500=0.00278 (USD); Mount: Surface Mount; Case/Package: 0603; Case Code (Metric): 1608; Contact Plating: Matte,Tin; Min Operating Temperature: -55°C; Max Operating Temperature: 155°C; Packaging: Tape and Reel; Resistance: 27R; Tolerance: 1%; Composition: Thick Film; Number of Terminations: 2; Features: Automotive AEC-Q200; Length: 0.061inch; Height: 0.022inch; Width: 0.031inch; Radiation Hardening: No; Lead Free: Lead Free; Number of Pins: 2; Package Quantity: 1; Military Standard: Not; Power Rating: 100mW; Termination: SMD/SMT; Voltage Rating (DC): 75V; Depth: 0.8mm; REACH SVHC: Unknown; ComponentLink1URL: https://www.alliedelec.com/m/d/623f45ff1957d936ff56d46fd1c28cac.pdf; ComponentLink1Description: https://www.alliedelec.com/m/d/623f45ff1957d936ff56d46fd1c28cac.pdf; ComponentLink2URL: http://www.farnell.com/datasheets/1678782.pdf; ComponentLink2Description: http://www.farnell.com/datasheets/1678782.pdf; ComponentLink3URL: http://industrial.panasonic.com/www-data/pdf/AOA0000/AOA0000CE2.pdf; ComponentLink3Description: http://industrial.panasonic.com/www-data/pdf/AOA0000/AOA0000CE2.pdf; ComponentLink4URL: http://www.mouser.com/ds/2/315/AOA0000CE2-37512.pdf; ComponentLink4Description: http://www.mouser.com/ds/2/315/AOA0000CE2-37512.pdf; Stock 2: 468467; Pricing 2: 1=0.1, 10=0.043, 100=0.0176, 1000=0.00791, 2500=0.00686 (USD); Weight: 7.1E-05oz; ComponentLink5URL: http://industrial.panasonic.com/www-data/pdf/AOA0000/AOA0000CE1.pdf; ComponentLink5Description: http://industrial.panasonic.com/www-data/pdf/AOA0000/AOA0000CE1.pdf; ComponentLink6URL: http://www.farnell.com/datasheets/1500035.pdf; ComponentLink6Description: http://www.farnell.com/datasheets/1500035.pdf; ComponentLink7URL: http://www.jameco.com/Jameco/Products/ProdDS/1988663.pdf; ComponentLink7Description: http://www.jameco.com/Jameco/Products/ProdDS/1988663.pdf; ComponentLink8URL: https://www.alliedelec.com/m/d/51cd0790071e1666bdb9d00c57fcf960.pdf; ComponentLink8Description: https://www.alliedelec.com/m/d/51cd0790071e1666bdb9d00c57fcf960.pdf; ComponentLink9URL: http://www.farnell.com/datasheets/1678796.pdf; ComponentLink9Description: http://www.farnell.com/datasheets/1678796.pdf; Stock 3: 9760; Pricing 3: 1=0.1, 10=0.068, 100=0.0275, 1000=0.01236, 2500=0.01073 (USD); ComponentLink10URL: http://www.yageo.com/documents/recent/PYu-RT_1-to-0.01_RoHS_L_8.pdf; ComponentLink10Description: http://www.yageo.com/documents/recent/PYu-RT_1-to-0.01_RoHS_L_8.pdf; ComponentLink11URL: http://www.mouser.com/ds/2/447/yageodocoutput-1125656.pdf; ComponentLink11Description: http://www.mouser.com/ds/2/447/yageodocoutput-1125656.pdf; .SCHCHK: USED; Supplier 1: Digi-Key; Supplier Part Number 1: RMCF0603FT27R0CT-ND
footprint R-0603
pins: 1, 2

## R-27R-0805
designator R?, comment 27R  Case Code (Imperial): 0805
RES SMD 27 OHM 5% 1/8W 0805; Manufacturer: Vishay Dale; Manufacturer Part Number: CRCW080527R0JNEA; Temperature Coefficient: 200ppm/°C; Max Power Dissipation: 125mW; Voltage Rating: 150V; .PCBCHK: USED; .Creator: F:TALI; Washability: OK; Supplier 1: Digi-Key; Supplier Part Number 1: 541-27ACT-ND; Stock 1: 5615; Pricing 1: 1=0.1, 10=0.044, 100=0.0178, 1000=0.00802, 2500=0.00696 (USD); Case/Package: 0805; Number of Pins: 2; Weight: 0.000194oz; Case Code (Metric): 2012; Contact Plating: Tin; Min Operating Temperature: -55°C; Max Operating Temperature: 155°C; Resistance: 27R; Tolerance: 5%; Composition: Thick Film; Packaging: Tape and Reel; Package Quantity: 1; Number of Terminations: 2; Features: Automotive AEC-Q200; Power Rating: 125mW; Termination: SMD/SMT; Military Standard: Not; Voltage Rating (DC): 150V; Working Voltage: 150V; Length: 2mm; Height: 0.02inch; Width: 0.049inch; Depth: 1.25mm; Radiation Hardening: No; Lead Free: Lead Free; REACH SVHC: Unknown; ComponentLink1URL: https://www.alliedelec.com/m/d/0c934d6939ccefa68dbe0b96d821c8cf.pdf; ComponentLink1Description: https://www.alliedelec.com/m/d/0c934d6939ccefa68dbe0b96d821c8cf.pdf; ComponentLink2URL: http://www.vishay.com/docs/20035/dcrcwe3.pdf; ComponentLink2Description: http://www.vishay.com/docs/20035/dcrcwe3.pdf; ComponentLink3URL: http://www.mouser.com/ds/2/427/dcrcwe3-109170.pdf; ComponentLink3Description: http://www.mouser.com/ds/2/427/dcrcwe3-109170.pdf; .SCHCHK: USED
footprint R-0805
pins: 1, 2

## R-30K9-0603
designator R?, comment 30K9  Case/Package: 0603
RES SMD 30.9K OHM 1% 1/10W 0603; Manufacturer: Stackpole Electronics; Manufacturer Part Number: RMCF0603FT30K9; Resistance: 30.9kR; Max Power Dissipation: 100mW; Temperature Coefficient: 100ppm/°C; Washability: OK; .Creator: M.OZKAN; .PCBCHK: USED; Supplier 1: Digi-Key; Supplier Part Number 1: RMCF0603FT30K9CT-ND; Stock 1: 59950; Pricing 1: 1=0.10000, 10=0.01600, 100=0.00650, 1000=0.00292, 2500=0.00253 (USD); RoHS: Yes; Mount: Surface Mount; Case Code (Metric): 1608; Case Code (Imperial): 0603; Contact Plating: Tin,Matte; Min Operating Temperature: -55°C; Max Operating Temperature: 155°C; Tolerance: 1%; Packaging: Tape and Reel; Composition: Thick Film; Number of Terminations: 2; Features: Automotive AEC-Q200; Length: 0.061inch; Height: 0.022inch; Width: 0.031inch; Radiation Hardening: No; Lead Free: Lead Free; ComponentLink1URL: https://www.seielect.com/Catalog/SEI-RMCF_RMCP.pdf?src-supplier=Digi-Key; ComponentLink1Description: https://www.seielect.com/Catalog/SEI-RMCF_RMCP.pdf?src-supplier=Digi-Key; ComponentLink2URL: https://www.seielect.com/catalog/SEI-Packaging.pdf?src-supplier=Digi-Key; ComponentLink2Description: https://www.seielect.com/catalog/SEI-Packaging.pdf?src-supplier=Digi-Key; ComponentLink3URL: https://www.seielect.com/catalog/SEI-RMCF_RMCP.pdf?src-supplier=Avnet; ComponentLink3Description: https://www.seielect.com/catalog/SEI-RMCF_RMCP.pdf?src-supplier=Avnet; .SCHCHK: USED
footprint R-0603
pins: 1, 2

## R-30K-0603
designator R?, comment 30K  Case Code (Imperial): 0603
RES SMD 30K OHM 5% 1/4W 0603; Manufacturer: Rohm; Manufacturer Part Number: ESR03EZPJ303; Resistance: 30kR; Max Power Dissipation: 250mW; Temperature Coefficient: 200ppm/°C; .PCBCHK: USED; .Creator: F:TALI; Washability: OK; Supplier 1: Digi-Key; Supplier Part Number 1: RHM30KDCT-ND; Stock 1: 5256; Pricing 1: 1=0.1, 10=0.087, 100=0.0333, 1000=0.01464, 2500=0.01264 (USD); Case/Package: 0603; Case Code (Metric): 1608; Min Operating Temperature: -55°C; Max Operating Temperature: 155°C; Package Quantity: 5000; Packaging: Tape and Reel; Tolerance: 5%; Composition: Thick Film; Number of Terminations: 2; Features: Automotive AEC-Q200; Length: 0.063inch; Height: 0.022inch; Width: 0.031inch; ComponentLink1URL: http://www.rohm.com/web/global/datasheet/ESR01MZPF/esr-e; ComponentLink1Description: http://www.rohm.com/web/global/datasheet/ESR01MZPF/esr-e; .SCHCHK: USED
footprint R-0603
pins: 1, 2

## R-33K-0603
designator R?, comment 33K  Case Code (Imperial): 0603
RES SMD 33K OHM 5% 1/10W 0603; Manufacturer: Yageo; Manufacturer Part Number: RC0603JR-0733KL; Resistance: 33kR; Power Rating: 100mW; Voltage Rating: 75V; Voltage Rating (DC): 50V; Temperature Coefficient: 100ppm/°C; .PCBCHK: USED; .Creator: F:TALI; Washability: OK; Stock 1: 941006; Pricing 1: 1=0.1, 10=0.022, 100=0.0088, 1000=0.00396, 2500=0.00344 (USD); Case/Package: 0603; Number of Pins: 2; Weight: 7.1E-05oz; Case Code (Metric): 1608; Min Operating Temperature: -55°C; Max Operating Temperature: 155°C; Tolerance: 5%; Packaging: Tape and Reel; Package Quantity: 1; Composition: Thick Film; Number of Terminations: 2; Termination: SMD/SMT; Military Standard: Not; Max Power Dissipation: 100mW; Features: Moisture Resistant; Length: 1.6mm; Height: 0.022inch; Width: 0.8mm; Depth: 0.8mm; REACH SVHC: No SVHC; Lead Free: Lead Free; ComponentLink1URL: http://www.yageo.com/documents/recent/PYu-RC_Group_51_RoHS_L_9.pdf; ComponentLink1Description: http://www.yageo.com/documents/recent/PYu-RC_Group_51_RoHS_L_9.pdf; ComponentLink2URL: http://www.farnell.com/datasheets/443971.pdf; ComponentLink2Description: http://www.farnell.com/datasheets/443971.pdf; ComponentLink3URL: https://www.ozdisan.com/pasif-komponentler/direncler/smt-smd-direncler/0603SAF3302T5E; ComponentLink3Description: https://www.ozdisan.com/pasif-komponentler/direncler/smt-smd-direncler/0603SAF3302T5E; Stock 2: 19087; Pricing 2: 1=0.18, 10=0.152, 100=0.0596, 1000=0.02495, 2500=0.02287 (USD); Stock 3: 5000; Pricing 3: 5000=0.00301, 50000=0.00215, 200000=0.002 (USD); .SCHCHK: USED; Supplier 1: Digi-Key; Supplier Part Number 1: 311-33KGRDKR-ND
footprint R-0603
pins: 1, 2

## R-33R-0402
designator R?, comment 33R  Tolerance: 1%  Case/Package: 0402
RES SMD 33 OHM 1% 1/10W 0402; Manufacturer: Panasonic; Manufacturer Part Number: ERJ-2RKF33R0X; Temperature Coefficient: 100ppm/°C; Power Rating: 100mW; Voltage Rating: 50V; Washability: OK; .Creator: M.OZKAN; .PCBCHK: USED; Supplier 1: Digi-Key; Stock 1: 2659448; Pricing 1: 1=0.10000, 10=0.05100, 100=0.02070, 1000=0.00928, 2500=0.00806, 5000=0.00665 (USD); RoHS: Yes; Mount: Surface Mount; Number of Pins: 2; Contact Plating: Tin; Case Code (Metric): 1005; Min Operating Temperature: -55°C; Max Operating Temperature: 155°C; Resistance: 33R; Composition: Thick Film; Packaging: Tape and Reel; Package Quantity: 1; Number of Terminations: 2; Termination: SMD/SMT; Military Standard: Not; Max Power Dissipation: 100mW; Voltage Rating (DC): 50V; Features: Automotive AEC-Q200; Length: 1mm; Height: 0.35mm; Width: 0.02inch; Depth: 0.5mm; Radiation Hardening: No; REACH SVHC: No SVHC; Lead Free: Lead Free; ComponentLink1URL: https://datasheet.ciiva.com/11821/0900766b80f80784-11821292.pdf?src-supplier=RSComponents; ComponentLink1Description: https://datasheet.ciiva.com/11821/0900766b80f80784-11821292.pdf?src-supplier=RSComponents; ComponentLink2URL: https://datasheet.ciiva.com/43467/1678782-43467173.pdf?src-supplier=Farnell; ComponentLink2Description: https://datasheet.ciiva.com/43467/1678782-43467173.pdf?src-supplier=Farnell; ComponentLink3URL: https://datasheet.ciiva.com/5917/aoa0000ce2-5917817.pdf?src-supplier=Farnell; ComponentLink3Description: https://datasheet.ciiva.com/5917/aoa0000ce2-5917817.pdf?src-supplier=Farnell; ComponentLink4URL: https://datasheet.ciiva.com/16777/70260748-16777705.pdf?src-supplier=Allied+Electronics; ComponentLink4Description: https://datasheet.ciiva.com/16777/70260748-16777705.pdf?src-supplier=Allied+Electronics; ComponentLink5URL: https://datasheet.ciiva.com/46373/1678782-46373081.pdf?src-supplier=Element14; ComponentLink5Description: https://datasheet.ciiva.com/46373/1678782-46373081.pdf?src-supplier=Element14; ComponentLink6URL: https://datasheet.ciiva.com/7836/aoa0000ce2-7836490.pdf?src-supplier=Element14; ComponentLink6Description: https://datasheet.ciiva.com/7836/aoa0000ce2-7836490.pdf?src-supplier=Element14; ComponentLink7URL: https://datasheet.ciiva.com/46373/1678782-46373082.pdf?src-supplier=Element14; ComponentLink7Description: https://datasheet.ciiva.com/46373/1678782-46373082.pdf?src-supplier=Element14; ComponentLink8URL: https://datasheet.ciiva.com/9190/aoa0000ce2-9190507.pdf?src-supplier=Avnet; ComponentLink8Description: https://datasheet.ciiva.com/9190/aoa0000ce2-9190507.pdf?src-supplier=Avnet; ComponentLink9URL: https://datasheet.ciiva.com/17210/aoa0000ce2-17210220.pdf?src-supplier=Avnet+Europe; ComponentLink9Description: https://datasheet.ciiva.com/17210/aoa0000ce2-17210220.pdf?src-supplier=Avnet+Europe; ComponentLink10URL: https://datasheet.ciiva.com/7836/426256-7836813.pdf?src-supplier=Element14; ComponentLink10Description: https://datasheet.ciiva.com/7836/426256-7836813.pdf?src-supplier=Element14; ComponentLink11URL: https://datasheet.ciiva.com/16514/aoa0000ce2-16514334.pdf?src-supplier=Avnet+Asia; ComponentLink11Description: https://datasheet.ciiva.com/16514/aoa0000ce2-16514334.pdf?src-supplier=Avnet+Asia; ComponentLink12URL: https://datasheet.ciiva.com/24023/aoa0000ce2-24023999.pdf?src-supplier=Mouser; ComponentLink12Description: https://datasheet.ciiva.com/24023/aoa0000ce2-24023999.pdf?src-supplier=Mouser; Supplier Part Number 1: P33.0LCT-ND; Case Code (Imperial): 0402; .SCHCHK: USED
footprint R-0402
pins: 1, 2

## R-33R-0402-1
designator R?, comment 33R  Case/Package: 0402
RES SMD 33 OHM 1% 1/10W 0402; Manufacturer: Panasonic; Manufacturer Part Number: ERJ2RKF33R0X; Temperature Coefficient: 100ppm/°C; Power Rating: 100mW; Voltage Rating: 50V; .Creator: F:TALI; .PCBCHK: USED; Washability: OK; Supplier 1: Digi-Key; Stock 1: 5091185; Pricing 1: 1 = 0.10000, 10 = 0.05600, 100 = 0.02270, 1000 = 0.01018, 2500 = 0.00884, 5000 = 0.00730 (USD); RoHS: Yes; Mount: Surface Mount; Number of Pins: 2; Case Code (Metric): 1005; Contact Plating: Tin; Min Operating Temperature: -55°C; Max Operating Temperature: 155°C; Resistance: 33R; Packaging: Tape and Reel; Composition: Thick Film; Package Quantity: 1; Voltage Rating (DC): 50V; Termination: SMD/SMT; Military Standard: Not; Number of Terminations: 2; Max Power Dissipation: 100mW; Features: Automotive AEC-Q200; Length: 1mm; Height: 0.35mm; Width: 0.02inch; Depth: 0.5mm; Radiation Hardening: No; REACH SVHC: No SVHC; Lead Free: Lead Free; ComponentLink1URL: http://www.farnell.com/datasheets/1911175.pdf?src-supplier=Farnell; ComponentLink1Description: http://www.farnell.com/datasheets/1911175.pdf?src-supplier=Farnell; ComponentLink2URL: http://industrial.panasonic.com/www-data/pdf/AOA0000/AOA0000CE2.pdf?src-supplier=Farnell; ComponentLink2Description: http://industrial.panasonic.com/www-data/pdf/AOA0000/AOA0000CE2.pdf?src-supplier=Farnell; ComponentLink3URL: https://industrial.panasonic.com/cdbs/www-data/pdf/RDA0000/DMA0000COL11.pdf?src-supplier=Allied+Electronics; ComponentLink3Description: https://industrial.panasonic.com/cdbs/www-data/pdf/RDA0000/DMA0000COL11.pdf?src-supplier=Allied+Electronics; ComponentLink4URL: http://www.farnell.com/datasheets/1911175.pdf?src-supplier=Element14; ComponentLink4Description: http://www.farnell.com/datasheets/1911175.pdf?src-supplier=Element14; ComponentLink5URL: http://industrial.panasonic.com/www-data/pdf/AOA0000/AOA0000CE2.pdf?src-supplier=Element14; ComponentLink5Description: http://industrial.panasonic.com/www-data/pdf/AOA0000/AOA0000CE2.pdf?src-supplier=Element14; ComponentLink6URL: https://industrial.panasonic.com/cdbs/www-data/pdf/RDA0000/DMA0000COL11.pdf?src-supplier=Avnet; ComponentLink6Description: https://industrial.panasonic.com/cdbs/www-data/pdf/RDA0000/DMA0000COL11.pdf?src-supplier=Avnet; ComponentLink7URL: http://industrial.panasonic.com/www-data/pdf/AOA0000/AOA0000CE2.pdf?src-supplier=Avnet+Europe; ComponentLink7Description: http://industrial.panasonic.com/www-data/pdf/AOA0000/AOA0000CE2.pdf?src-supplier=Avnet+Europe; ComponentLink8URL: http://www.farnell.com/datasheets/426256.pdf?src-supplier=Element14; ComponentLink8Description: http://www.farnell.com/datasheets/426256.pdf?src-supplier=Element14; ComponentLink9URL: https://industrial.panasonic.com/cdbs/www-data/pdf/RDA0000/DMA0000COL11.pdf?src-supplier=Avnet+Asia; ComponentLink9Description: https://industrial.panasonic.com/cdbs/www-data/pdf/RDA0000/DMA0000COL11.pdf?src-supplier=Avnet+Asia; ComponentLink10URL: https://industrial.panasonic.com/cdbs/www-data/pdf/RDA0000/DMA0000COL11.pdf?src-supplier=Mouser; ComponentLink10Description: https://industrial.panasonic.com/cdbs/www-data/pdf/RDA0000/DMA0000COL11.pdf?src-supplier=Mouser; Supplier Part Number 1: P33.0LCT-ND; Tolerance: 1%; Case Code (Imperial): 0402; .SCHCHK: USED
footprint R-0402
pins: 1, 2

## R-33R-0603
designator R?, comment 33R  Case Code (Imperial): 0603
RES SMD 33 OHM 5% 1/10W 0603; Manufacturer: Yageo; Manufacturer Part Number: RC0603JR-0733RL; Power Rating: 100mW; Voltage Rating: 50V; Temperature Coefficient: 100ppm/°C; .PCBCHK: USED; .Creator: F:TALI; Washability: OK; Stock 1: 0; Pricing 1: 1=0.1, 10=0.022, 100=0.0088, 1000=0.00396, 2500=0.00344 (USD); Case/Package: 0603; Number of Pins: 2; Case Code (Metric): 1608; Min Operating Temperature: -55°C; Max Operating Temperature: 155°C; Package Quantity: 1; Resistance: 33R; Tolerance: 5%; Packaging: Tape and Reel; Voltage Rating (DC): 50V; Composition: Thick Film; Number of Terminations: 2; Termination: SMD/SMT; Military Standard: Not; Max Power Dissipation: 100mW; Features: Moisture Resistant; Length: 0.063inch; Height: 0.022inch; Width: 0.031inch; Depth: 0.8mm; REACH SVHC: No SVHC; Lead Free: Lead Free; ComponentLink1URL: http://www.yageo.com/documents/recent/PYu-RC_Group_51_RoHS_L_9.pdf; ComponentLink1Description: http://www.yageo.com/documents/recent/PYu-RC_Group_51_RoHS_L_9.pdf; ComponentLink2URL: http://www.farnell.com/datasheets/1868787.pdf; ComponentLink2Description: http://www.farnell.com/datasheets/1868787.pdf; ComponentLink3URL: http://www.farnell.com/datasheets/443971.pdf; ComponentLink3Description: http://www.farnell.com/datasheets/443971.pdf; Stock 2: 1443398; Pricing 2: 1=0.1, 10=0.065, 100=0.0264, 1000=0.01186, 2500=0.01029 (USD); Mount: Surface Mount; Contact Plating: Tin; Radiation Hardening: No; ComponentLink4URL: http://www.farnell.com/datasheets/426256.pdf; ComponentLink4Description: http://www.farnell.com/datasheets/426256.pdf; ComponentLink5URL: https://www.alliedelec.com/m/d/623f45ff1957d936ff56d46fd1c28cac.pdf; ComponentLink5Description: https://www.alliedelec.com/m/d/623f45ff1957d936ff56d46fd1c28cac.pdf; ComponentLink6URL: http://industrial.panasonic.com/www-data/pdf/AOA0000/AOA0000CE2.pdf; ComponentLink6Description: http://industrial.panasonic.com/www-data/pdf/AOA0000/AOA0000CE2.pdf; ComponentLink7URL: http://www.farnell.com/datasheets/1678782.pdf; ComponentLink7Description: http://www.farnell.com/datasheets/1678782.pdf; ComponentLink8URL: http://www.mouser.com/ds/2/315/AOA0000C283-1093288.pdf; ComponentLink8Description: http://www.mouser.com/ds/2/315/AOA0000C283-1093288.pdf; Stock 3: 1779079; Pricing 3: 1=0.1, 10=0.043, 100=0.0176, 1000=0.00791, 2500=0.00686 (USD); ComponentLink9URL: https://www.verical.com/server-webapp/html/getDatasheet?partID=52004; ComponentLink9Description: https://www.verical.com/server-webapp/html/getDatasheet?partID=52004; ComponentLink10URL: http://www.mouser.com/ds/2/315/AOA0000CE1-37422.pdf; ComponentLink10Description: http://www.mouser.com/ds/2/315/AOA0000CE1-37422.pdf; ComponentLink11URL: http://www.farnell.com/datasheets/2059623.pdf; ComponentLink11Description: http://www.farnell.com/datasheets/2059623.pdf; ComponentLink12URL: http://industrial.panasonic.com/www-data/pdf/AOA0000/AOA0000CE1.pdf; ComponentLink12Description: http://industrial.panasonic.com/www-data/pdf/AOA0000/AOA0000CE1.pdf; ComponentLink13URL: http://www.farnell.com/datasheets/1500035.pdf; ComponentLink13Description: http://www.farnell.com/datasheets/1500035.pdf; .SCHCHK: USED; Supplier 1: Digi-Key; Supplier Part Number 1: 311-33GRDKR-ND
footprint R-0603
pins: 1, 2

## R-33R-0805
designator R?, comment 33R  Case Code (Imperial): 0805
RES SMD 33 OHM 1/8W 5% 0805; Manufacturer: Stackpole Electronics; Manufacturer Part Number: RMCF0805JT33R0; Max Power Dissipation: 125mW; Temperature Coefficient: 200ppm/°C; Voltage Rating: 150V; .PCBCHK: USED; .Creator: F:TALI; Washability: OK; Stock 1: 78652; Pricing 1: 1=0.1, 10=0.021, 100=0.0086, 1000=0.00385, 2500=0.00334 (USD); Mount: Surface Mount; Case/Package: 0805; Case Code (Metric): 2012; Contact Plating: Matte,Tin; Min Operating Temperature: -55°C; Max Operating Temperature: 155°C; Resistance: 33R; Tolerance: 5%; Packaging: Tape and Reel; Composition: Thick Film; Number of Terminations: 2; Military Standard: Not; Features: Automotive AEC-Q200; Length: 0.079inch; Height: 0.026inch; Width: 0.049inch; Depth: 1.25mm; Radiation Hardening: No; Stock 2: 29789; Pricing 2: 1=0.1, 10=0.091, 100=0.0351, 1000=0.01544, 2500=0.01334 (USD); Power Rating: 125mW; Termination: SMD/SMT; Package Quantity: 5000; Thickness: 508um; ComponentLink1URL: http://www.mouser.com/ds/2/54/chpreztr-977002.pdf; ComponentLink1Description: http://www.mouser.com/ds/2/54/chpreztr-977002.pdf; ComponentLink2URL: http://www.bourns.com/pdfs/chpreztr.pdf; ComponentLink2Description: http://www.bourns.com/pdfs/chpreztr.pdf; Stock 3: 589500; Pricing 3: 100=0.02599, 1000=0.01177, 5000=0.00537, 15000=0.00458, 50000=0.00395 (USD); .SCHCHK: USED; Supplier 1: Digi-Key; Supplier Part Number 1: RMCF0805JT33R0DKR-ND
footprint R-0805
pins: 1, 2